# Altium footprint library Emirhan's.PcbLib: 51 footprints (part 3 of 4)
Each footprint in its own frame and in the unit in brackets; x right, y up, seen from the top. Pads: shape width x height; smd on the part's side, far side on the other; paste and mask are expansions set on the pad; w line width, h text height; cw(c..) or ccw(c..) is an arc to the next point about the centre after c.
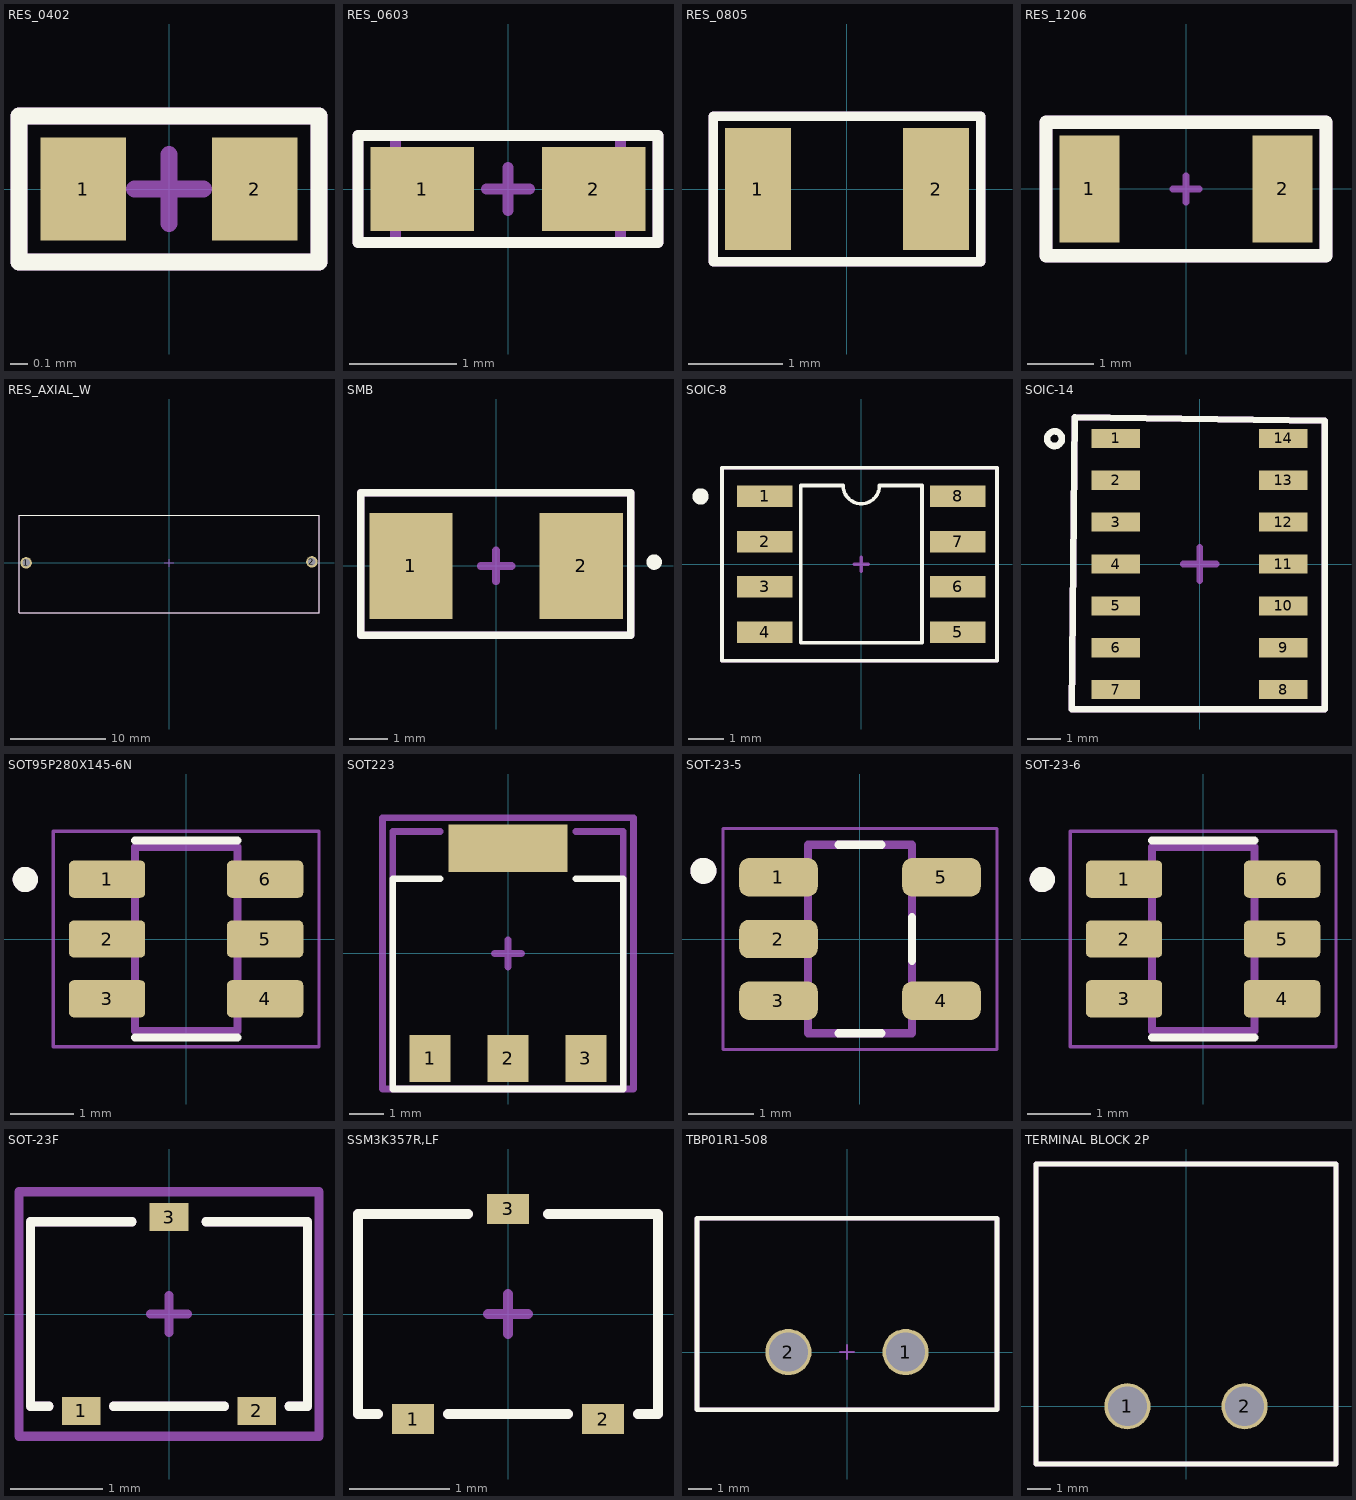
[diagram p2: the footprints below, top view; thin cyan lines are the x and y axes]

## RES_0402 [mm]
pads (2):
  rect 0.5x0.6 smd mask+0.05: 1(-0.5,0) 2(0.5,0)
Top Overlay:
  lines w0.1: -0.875,-0.425 -0.875,0.425 0.875,0.425 0.875,-0.425 -0.875,-0.425
Top 3D Body:
  lines w0.1: -0.875,-0.425 -0.875,0.425 0.875,0.425 0.875,-0.425 -0.875,-0.425
Top Component Center:
  lines w0.1: -0.2,0 0.2,0 ; 0,-0.2 0,0.2 ; -0.875,-0.425 -0.875,0.425 0.875,0.425 0.875,-0.425 -0.875,-0.425
Top Designator:
  lines w0.1: -0.875,-0.425 0.875,-0.425 0.875,0.425 -0.875,0.425 -0.875,-0.425
3D body "User Library-User Library-RES0402-2.step": height 0.35, standoff 0, extent -0.5,-0.25 0.5,0.25

## RES_0603 [mil]
pads (2):
  rect 38x31 smd mask+1.97: 1(-31.5,0) 2(31.5,0)
Top Overlay:
  lines w3.94: -55.12,-19.68 -55.12,19.68 55.12,19.68 55.12,-19.68 -55.12,-19.68
Top 3D Body:
  lines w3.94: -41.34,-19.68 -41.34,19.68 41.34,19.68 41.34,-19.68 -41.34,-19.68
Top Component Center:
  lines w3.94: -7.87,0 7.87,0 ; 0,-7.87 0,7.87 ; -55.12,-19.68 -55.12,19.68 55.12,19.68 55.12,-19.68 -55.12,-19.68
Top Designator:
  lines w3.94: -55.12,-19.68 -55.12,19.68 55.12,19.68 55.12,-19.68 -55.12,-19.68
  text ".Designator" at 5.25,-78.71 h15.75
3D body "User Library-R_0603.step": height 19.68, standoff 0, extent -31.5,-17.72 31.5,17.72

## RES_0805 [mm]
pads (2):
  rect 0.7x1.3 smd mask+0.05: 1(-0.95,0) 2(0.95,0)
Top Overlay:
  lines w0.1: -1.425,-0.775 -1.425,0.775 1.425,0.775 1.425,-0.775 -1.425,-0.775
Top 3D Body:
  lines w0.1: -1.425,-0.775 -1.425,0.775 1.425,0.775 1.425,-0.775 -1.425,-0.775
Top Designator:
  lines w0.1: -1.425,-0.775 -1.425,0.775 1.425,0.775 1.425,-0.775 -1.425,-0.775
  text ".Designator" at 0.233,-0.9 h0.5
3D body "User Library-RES0805-2.step": height 0.55, standoff 0, extent -1.05,-0.625 0.95,0.625

## RES_1206 [mm]
pads (2):
  rect 0.9x1.6 smd mask+0.05: 1(-1.45,0) 2(1.45,0)
Top Overlay:
  lines w0.2: -2.1,-1 -2.1,1 2.1,1 2.1,-1 -2.1,-1
Top 3D Body:
  lines w0.2: -2.1,-1 2.1,-1 2.1,1 -2.1,1 -2.1,-1
Top Component Center:
  lines w0.1: -0.2,0 0.2,0 ; 0,-0.2 0,0.2
  lines w0.2: -2.1,-1 -2.1,1 2.1,1 2.1,-1 -2.1,-1
Top Designator:
  lines w0.2: -2.1,-1 -2.1,1 2.1,1 2.1,-1 -2.1,-1
  text ".Designator" at 0.433,-1.3 h0.8
3D body "User Library-RES1206-2.step": height 0.55, standoff 0, extent -1.505,-0.775 1.505,0.775

## RES_AXIAL_W [mm]
pads (2):
  round 1.2 hole 0.8 mask+0.05: 1(-15,0) 2(15,0.1)
Top Overlay:
  lines w0.1: -15.75,-5.25 15.75,-5.25 15.75,5 -15.75,5 -15.75,-5.25
Top 3D Body:
  lines w0.1: -15.75,-5.25 15.75,-5.25 15.75,5 -15.75,5 -15.75,-5.25
Top Component Center:
  lines w0.1: -0.5,0 0.5,0 ; 0,-0.4 0,0.4 ; -15.75,-5.25 15.75,-5.25 15.75,5 -15.75,5 -15.75,-5.25
Top Designator:
  lines w0.1: -15.75,-5.25 15.75,-5.25 15.75,5 -15.75,5 -15.75,-5.25
  text ".Designator" at -0.8,-1.767 h1
3D body: height 5.1, standoff 4.3, extent 6.4,-0.4 15.4,0.4
3D body: height 5, standoff -4, extent 14.6,-0.4 15.4,0.4
3D body: height 5.1, standoff 4.3, extent -15.4,-0.4 -6.4,0.4
3D body: height 5, standoff -4, extent -15.4,-0.4 -14.6,0.4
3D body: height 9.65, standoff 0, extent -11,-4.925 11,4.725

## SMB [mm]
pads (2):
  rect 2.159x2.743 smd mask+0.05: 1(-2.21,0) 2(2.21,0)
Top Overlay:
  circle w0.2: c4.1,0.1 r0.1
  lines w0.2: -3.51,-1.8 3.49,-1.8 3.49,1.9 -3.51,1.9 -3.51,-1.8
Top 3D Body:
  lines w0.2: -3.51,-1.8 3.49,-1.8 3.49,1.9 -3.51,1.9 -3.51,-1.8
Top Component Center:
  lines w0.2: -0.4,0 0.4,0 ; 0,-0.4 0,0.4
Top Designator:
  lines w0.2: -3.51,-1.8 3.49,-1.8 3.49,1.9 -3.51,1.9 -3.51,-1.8
  text ".Designator" at 0.333,-1 h0.8
3D body "1SMB5919BT3G.STEP": height 2.39, standoff -0.08, extent -2.73,-1.66 2.71,1.9

## SOIC-8 [mm]
pads (8):
  rect 1.55x0.6 smd mask+0.05: 1(-2.7,1.905) 2(-2.7,0.635) 3(-2.7,-0.635) 4(-2.7,-1.905) 5(2.7,-1.905) 6(2.7,-0.635) 7(2.7,0.635) 8(2.7,1.905)
Top Overlay:
  circle w0.254: c-4.5,1.9 r0.1
  lines w0.1: -3.9,-2.7 -3.9,2.7 3.8,2.7 3.8,-2.7 -3.9,-2.7 ; -1.7,-2.195 -1.7,2.205 -0.51,2.205 ccw(c0,2.205) 0.51,2.205 1.7,2.205 1.7,-2.195 -1.7,-2.195
Top 3D Body:
  lines w0.1: -3.9,-2.7 -3.9,2.7 3.8,2.7 3.8,-2.7 -3.9,-2.7
Top Component Center:
  lines w0.1: -0.2,0 0.2,0 ; 0,-0.2 0,0.2 ; -3.9,-2.7 -3.9,2.7 3.8,2.7 3.8,-2.7 -3.9,-2.7
Top Designator:
  lines w0.1: -3.9,-2.7 -3.9,2.7 3.8,2.7 3.8,-2.7 -3.9,-2.7
  text ".Designator" at -0.85,-0.283 h0.8
3D body "LM2675MX-12_NOPB.STEP": height 1.75, standoff 0, extent -3,-2.445 3,2.455

## SOIC-14 [mm]
pads (14):
  rect 1.48x0.58 smd mask+0.05: 1(-2.54,3.81) 2(-2.54,2.54) 3(-2.54,1.27) 4(-2.54,0) 5(-2.54,-1.27) 6(-2.54,-2.54) 7(-2.54,-3.81) 8(2.54,-3.81) 9(2.54,-2.54) 10(2.54,-1.27) 11(2.54,0) 12(2.54,1.27) 13(2.54,2.54) 14(2.54,3.81)
Top Overlay:
  circle w0.2: c-4.4,3.8 r0.224
  lines w0.2: -3.88,-4.4 -3.783,4.447 3.8,4.35 3.8,-4.4 -3.88,-4.4
Top 3D Body:
  lines w0.2: -3.88,-4.4 3.8,-4.4 3.8,4.35 -3.783,4.447 -3.88,-4.4
Top Component Center:
  lines w0.2: -0.5,0 0.5,0 ; 0,-0.5 0,0.5 ; -3.88,-4.4 -3.783,4.447 3.8,4.35 3.8,-4.4 -3.88,-4.4
Top Designator:
  lines w0.2: -3.88,-4.4 3.8,-4.4 3.8,4.35 -3.783,4.447 -3.88,-4.4
  text ".Designator" at -1.3,-0.333 h0.8
3D body "NCS36000DRG.step": height 1.83, standoff 0.03, extent -3,-4.28 3,4.28

## SOT95P280X145-6N [mm]
pads (6):
  rrect25% 1.21x0.59 smd: 1(-1.255,0.95) 2(-1.255,0) 3(-1.255,-0.95) 4(1.255,-0.95) 5(1.255,0) 6(1.255,0.95)
Top Overlay:
  circle w0.2: c-2.555,0.945 r0.1
  lines w0.127: -0.813,-1.565 0.813,-1.565 ; -0.813,1.565 0.813,1.565
Top Designator:
  lines w0.05: -2.11,-1.713 -2.11,1.713 2.11,1.713 2.11,-1.713 -2.11,-1.713
  text ".Designator" at -0.4,-0.333 h0.5
Mechanical 13:
  circle w0.2: c-2.555,0.945 r0.1
  lines w0.127: -0.813,-1.462 -0.813,1.462 0.813,1.462 0.813,-1.462 -0.813,-1.462
3D body "step_temp.STEP": height 1.4, standoff -0.05, extent -1.4,-1.462 1.4,1.462

## SOT223 [mm]
pads (4):
  rect 1.2x1.4 smd mask+0.05: 1(-2.3,-3.1) 2(0,-3.1) 3(2.3,-3.1)
  rect 3.5x1.4 smd mask+0.05: ""(0,3.1)
Top Overlay:
  lines w0.2: -2,2.2 -3.4,2.2 -3.4,-4 3.4,-4 3.4,2.2 2,2.2
Top 3D Body:
  lines w0.2: -2,3.6 -3.4,3.6 -3.4,-4 3.4,-4 3.4,3.6 2,3.6
Top Component Center:
  lines w0.2: -0.4,0 0.4,0 ; 0,-0.4 0,0.4
Top Designator:
  lines w0.2: -3.7,-4 -3.7,4 3.7,4 3.7,-4 -3.7,-4
  text ".Designator" at -1.1,-0.533 h0.8
3D body "CircuitWorks-SOT-223.step": height 1.65, standoff -0.03, extent -3.25,-3.48 3.25,3.48

## SOT-23-5 [mm]
pads (5):
  rrect50% 1.21x0.59 smd: 1(-1.255,0.95) 2(-1.255,0) 3(-1.255,-0.95) 4(1.255,-0.95) 5(1.255,0.95)
Top Overlay:
  circle w0.2: c-2.41,1.05 r0.1
  lines w0.127: -0.33,-1.45 0.33,-1.45 ; -0.33,1.45 0.33,1.45 ; 0.8,-0.335 0.8,0.335
Top Designator:
  lines w0.05: -2.11,-1.7 2.11,-1.7 2.11,1.7 -2.11,1.7 -2.11,-1.7
  text ".Designator" at -0.6,-0.233 h0.5
Mechanical 13:
  circle w0.2: c-2.41,1.05 r0.1
  lines w0.127: -0.8,-1.45 -0.8,1.45 0.8,1.45 0.8,-1.45 -0.8,-1.45
3D body "step_temp.STEP": height 1.41, standoff -0.04, extent -1.4,-1.45 1.4,1.45

## SOT-23-6 [mm]
pads (6):
  rrect25% 1.21x0.59 smd: 1(-1.255,0.95) 2(-1.255,0) 3(-1.255,-0.95) 4(1.255,-0.95) 5(1.255,0) 6(1.255,0.95)
Top Overlay:
  circle w0.2: c-2.555,0.945 r0.1
  lines w0.127: -0.813,-1.565 0.813,-1.565 ; -0.813,1.565 0.813,1.565
Top Designator:
  lines w0.05: -2.11,-1.713 -2.11,1.713 2.11,1.713 2.11,-1.713 -2.11,-1.713
  text ".Designator" at -0.8,-0.533 h0.5
Mechanical 13:
  circle w0.2: c-2.555,0.945 r0.1
  lines w0.127: -0.813,-1.462 -0.813,1.462 0.813,1.462 0.813,-1.462 -0.813,-1.462
3D body "step_temp.STEP": height 1.4, standoff -0.05, extent -1.4,-1.462 1.4,1.462

## SOT-23F [mm]
pads (3):
  rect 0.42x0.3 smd mask+0.05: 1(-0.95,-1.05) 2(0.95,-1.05) 3(0,1.05)
Top Overlay:
  lines w0.1: -1.3,-1 -1.5,-1 -1.5,1 -0.4,1 ; -0.6,-1 0.6,-1 ; 0.4,1 1.5,1 1.5,-1 1.3,-1
Top 3D Body:
  lines w0.1: -1.625,-1.325 1.625,-1.325 1.625,1.325 -1.625,1.325 -1.625,-1.325
Top Component Center:
  lines w0.1: -0.2,0 0.2,0 ; 0,-0.2 0,0.2
Top Designator:
  lines w0.1: -1.3,-1 -1.5,-1 -1.5,1 -0.4,1 ; -0.6,-1 0.6,-1 ; 0.4,1 1.5,1 1.5,-1 1.3,-1
  text ".Designator" at -0.6,-0.233 h0.5
3D body "SSM3K357R,LF.STEP": height 0.88, standoff 0, extent -1.45,-1.2 1.45,1.2

## SSM3K357R,LF [mm]
pads (3):
  rect 0.42x0.3 smd mask+0.05: 1(-0.95,-1.05) 2(0.95,-1.05) 3(0,1.05)
Top Overlay:
  lines w0.1: -1.3,-1 -1.5,-1 -1.5,1 -0.4,1 ; -0.6,-1 0.6,-1 ; 0.4,1 1.5,1 1.5,-1 1.3,-1
Top 3D Body:
  lines w0.1: -1.3,-1 -1.5,-1 -1.5,1 -0.4,1 ; -0.6,-1 0.6,-1 ; 0.4,1 1.5,1 1.5,-1 1.3,-1
Top Component Center:
  lines w0.1: -0.2,0 0.2,0 ; 0,-0.2 0,0.2
Top Designator:
  lines w0.1: -1.3,-1 -1.5,-1 -1.5,1 -0.4,1 ; -0.6,-1 0.6,-1 ; 0.4,1 1.5,1 1.5,-1 1.3,-1
  text ".Designator" at -0.8,-0.233 h0.5
3D body "SSM3K357R,LF.STEP": height 0.88, standoff 0, extent -1.45,-1.2 1.45,1.2

## TBP01R1-508 [mm]
pads (2):
  round 2 hole 1.7 mask+0.05: 1(2.54,0) 2(-2.54,0)
Top Overlay:
  lines w0.2: -6.5,-2.5 -6.5,5.8 6.5,5.8 6.5,-2.5 -6.5,-2.5
Top 3D Body:
  lines w0.2: -6.5,-2.5 -6.5,5.8 6.5,5.8 6.5,-2.5 -6.5,-2.5
Top Component Center:
  lines w0.1: -0.3,0 0.3,0 ; 0,-0.3 0,0.3
  lines w0.2: -6.5,-2.5 -6.5,5.8 6.5,5.8 6.5,-2.5 -6.5,-2.5
Top Designator:
  lines w0.2: -6.5,-2.5 6.5,-2.5 6.5,5.8 -6.5,5.8 -6.5,-2.5
  text ".Designator" at -1.2,2.367 h0.8
3D body "Same_Sky_TBP01R1-508-02BE.step": height 8.51, standoff -3.99, extent -5.88,-2 5.88,10

## TERMINAL BLOCK 2P [mm]
pads (2):
  round 2 hole 1.7 mask+0.05: 1(-2.54,0) 2(2.54,0)
Top Overlay:
  lines w0.2: -6.5,-2.5 -6.5,10.5 6.5,10.5 6.5,-2.5 -6.5,-2.5
Top 3D Body:
  lines w0.2: -6.5,-2.5 -6.5,10.5 6.5,10.5 6.5,-2.5 -6.5,-2.5
Top Designator:
  lines w0.2: -6.5,-2.5 -6.5,10.5 6.5,10.5 6.5,-2.5 -6.5,-2.5
  text ".Designator" at -3.3,3.467 h0.8
3D body "Same_Sky_TBP01R1-508-02BE.step": height 8.5, standoff -4, extent -5.88,-2 5.88,10